# Altium footprint library 排针排座.PcbLib: 344 footprints (part 22 of 22)
Each footprint in its own frame and in the unit in brackets; x right, y up, seen from the top. Pads: shape width x height; smd on the part's side, far side on the other; paste and mask are expansions set on the pad; w line width, h text height; cw(c..) or ccw(c..) is an arc to the next point about the centre after c.
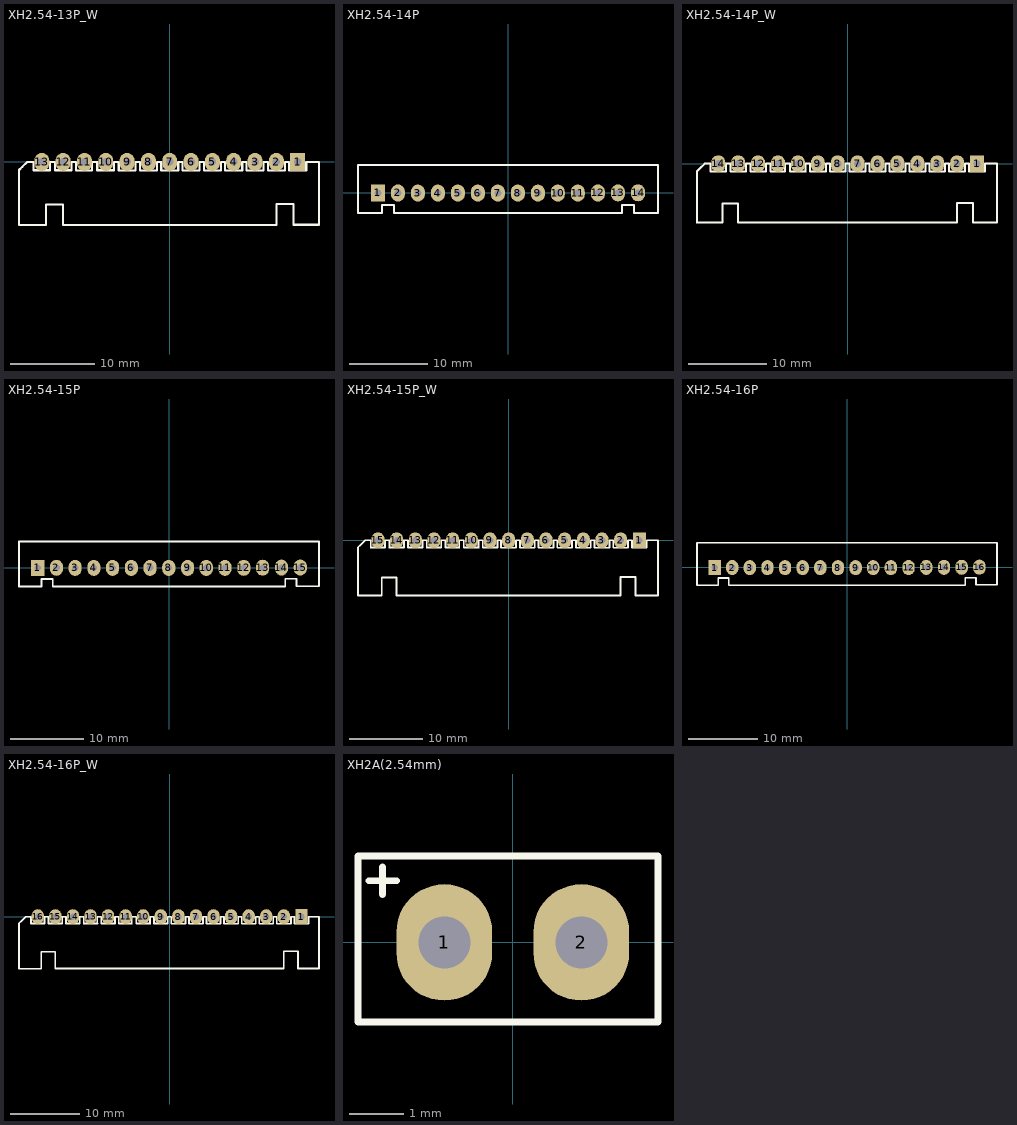
[diagram p21: the footprints below, top view; thin cyan lines are the x and y axes]

## XH2.54-13P_W [mil] "接插件，13P"
pads (13):
  rect 70x85 hole 35.43: 1(600,0)
  oval 70x85 hole 35.43: 2(500,0) 3(400,0) 4(300,0) 5(200,0) 6(100,0) 7(0,0) 8(-100,0) 9(-200,0) 10(-300,0) 11(-400,0) 12(-500,0) 13(-600,0)
Top Overlay:
  lines w10: -606.93,-295.35 -605.91,-296.38 ; -538.82,-39.45 -538.82,0 -561.34,0 -561.34,-38.66 -560.79,-39.21 -637.8,-39.21 -638.35,-38.66 -638.35,0 -668.9,0 -691.81,-22.91 -706.93,-38.03 -706.93,-295.35 -705.91,-296.38 -580,-296.38 -580,-199.13 -500,-199.13 -500,-295.35 500,-295.35 500,-197.09 580,-197.09 580,-294.88 700,-294.88 700,0 640,0 640,-40 560,-40 560,0 540,0 540,-40 460,-40 460,0 440,0 440,-40 360,-40 360,0 340,0 340,-40 260,-40 260,0 240,0 240,-40 160,-40 160,0 140,0 140,-40 60,-40 60,0 40,0 40,-40 -40,-40 -40,0 -60,0 -60,-40 -140,-40 -140,0 -160,0 -160,-39.45 -238.9,-39.45 -238.9,0 ; -538.35,0 -538.35,-38.66 -537.8,-39.21 -460.79,-39.21 -461.34,-38.66 -461.34,0 -438.82,0 -438.82,-39.45 -365.35,-39.45 -364.8,-38.9 -364.8,0 ; -364.33,0 -340.79,0 ; -340.24,-39.21 -340.24,0 ; -339.45,-39.21 -261.18,-39.21 -260.94,-38.98 -260.94,0 -239.45,0
3D body "XH2.54-13P_W.step": height 232.28, standoff -129.92, extent -690.13,-287.21 694.13,12

## XH2.54-14P [mil] "接插件，14P"
pads (14):
  rect 70x85 hole 35.43: 1(-650.5,-0.13)
  oval 70x85 hole 35.43: 2(-550.5,-0.13) 3(-451,-0.63) 4(-351,-0.63) 5(-251,-0.63) 6(-151,-0.63) 7(-51,-0.63) 8(49,-0.63) 9(149.5,-0.87) 10(249,-0.63) 11(349,-0.63) 12(449.5,-0.13) 13(550,0.37) 14(650.5,0.87)
Top Overlay:
  lines w10: 570.5,-100.13 -570.5,-100.13 -570.5,-60.13 -630.5,-60.13 -630.5,-100.13 -750.5,-100.13 -750.5,139.87 750.33,139.87 750.33,-99.13 630.5,-99.13 630.5,-59.13 570.5,-59.13 570.5,-99.13
3D body "XH2.54-14P.step": height 275.59, standoff -137.8, extent -744.25,-90.17 740,138.17

## XH2.54-14P_W [mil] "接插件，14P"
pads (14):
  rect 70x85 hole 35.43: 1(650,0)
  oval 70x85 hole 35.43: 2(550,0) 3(450,0) 4(350,0) 5(250,0) 6(150,0) 7(50,0) 8(-50,0) 9(-150,0) 10(-250,0) 11(-350,0) 12(-450,0) 13(-550,0) 14(-650,0)
Top Overlay:
  lines w10: -618.9,0 -588.35,0 ; -611.34,-38.66 -611.34,0 -588.82,0 -588.82,-39.45 ; -610.79,-39.21 -687.8,-39.21 -688.35,-38.66 -688.35,0 -718.9,0 -741.81,-22.91 -756.93,-38.03 -756.93,-295.35 -755.91,-296.38 -630,-296.38 -630,-199.13 -550,-199.13 -550,-295.35 550,-295.35 550,-197.09 630,-197.09 630,-294.88 750,-294.88 750,0 690,0 690,-40 610,-40 610,0 590,0 590,-40 510,-40 510,0 490,0 490,-40 410,-40 410,0 390,0 390,-40 310,-40 310,0 290,0 290,-40 210,-40 210,0 190,0 190,-40 110,-40 110,0 90,0 90,-40 10,-40 10,0 -10,0 -10,-40 -90,-40 -90,0 -110,0 -110,-39.45 -188.9,-39.45 -188.9,0 ; -511.34,-38.66 -511.34,0 -488.82,0 -488.82,-39.45 ; -510.79,-39.21 -587.8,-39.21 -588.35,-38.66 ; -488.35,0 -488.35,-38.66 -487.8,-39.21 -410.79,-39.21 ; -411.34,-38.66 -411.34,0 -388.82,0 -388.82,-39.45 -315.35,-39.45 -314.8,-38.9 -314.8,0 ; -314.33,0 -290.79,0 ; -290.24,-39.21 -290.24,0 ; -289.45,-39.21 -211.18,-39.21 -210.94,-38.98 -210.94,0 -189.45,0 ; -588.35,-38.66 -588.35,0 ; -588.35,-38.66 -588.35,0
3D body "XH2.54-14P_W.step": height 232.28, standoff -129.92, extent -740.13,-287.21 744.13,12

## XH2.54-15P [mil] "接插件，15P"
pads (15):
  rect 70x85 hole 35.43: 1(-700.75,-0.38)
  oval 70x85 hole 35.43: 2(-600.75,-0.38) 3(-501.25,-0.88) 4(-401.25,-0.88) 5(-301.25,-0.88) 6(-201.25,-0.88) 7(-101.25,-0.88) 8(-1.25,-0.88) 9(99.25,-1.12) 10(198.75,-0.88) 11(298.75,-0.88) 12(399.25,-0.38) 13(499.75,0.12) 14(600.25,0.62) 15(700.75,1.12)
Top Overlay:
  lines w10: 620.75,-100.38 -620.75,-100.38 -620.75,-60.38 -680.75,-60.38 -680.75,-100.38 -800.75,-100.38 -800.75,139.62 800.58,139.62 ; 620.75,-98.88 620.75,-58.88 680.75,-58.88 680.75,-98.88 800.58,-98.88 800.58,140.12
3D body "XH2.54-15P.step": height 275.59, standoff -137.8, extent -795,-92.35 789.25,136

## XH2.54-15P_W [mil] "接插件，15P"
pads (15):
  rect 70x85 hole 35.43: 1(700,0)
  oval 70x85 hole 35.43: 2(600,0) 3(500,0) 4(400,0) 5(300,0) 6(200,0) 7(100,0) 8(0,0) 9(-100,0) 10(-200,0) 11(-300,0) 12(-400,0) 13(-500,0) 14(-600,0) 15(-700,0)
Top Overlay:
  lines w10: -661.34,-38.66 -661.34,0 -638.82,0 -638.82,-39.45 ; -660.79,-39.21 -737.8,-39.21 -738.35,-38.66 -738.35,0 -768.9,0 -791.81,-22.91 -806.93,-38.03 -806.93,-295.35 -805.91,-296.38 -680,-296.38 -680,-199.13 -600,-199.13 -600,-295.35 600,-295.35 600,-197.09 680,-197.09 680,-294.88 800,-294.88 800,0 740,0 740,-40 660,-40 660,0 640,0 640,-40 560,-40 560,0 540,0 540,-40 460,-40 460,0 440,0 440,-40 360,-40 360,0 340,0 340,-40 260,-40 260,0 240,0 240,-40 160,-40 160,0 140,0 140,-40 60,-40 60,0 40,0 40,-40 -40,-40 -40,0 -60,0 -60,-39.45 -138.9,-39.45 -138.9,0 ; -568.9,0 -538.35,0 ; -561.34,-38.66 -561.34,0 -538.82,0 -538.82,-39.45 ; -560.79,-39.21 -637.8,-39.21 ; -461.34,-38.66 -461.34,0 -438.82,0 -438.82,-39.45 ; -460.79,-39.21 -537.8,-39.21 -538.35,-38.66 ; -438.35,0 -438.35,-38.66 -437.8,-39.21 -360.79,-39.21 ; -361.34,-38.66 -361.34,0 -338.82,0 -338.82,-39.45 -265.35,-39.45 -264.8,-38.9 -264.8,0 ; -264.33,0 -240.79,0 ; -240.24,-39.21 -240.24,0 ; -239.45,-39.21 -161.18,-39.21 -160.94,-38.98 -160.94,0 -139.45,0 ; -638.35,-38.66 -638.35,0 ; -638.35,-38.66 -637.8,-39.21 ; -638.35,-38.66 -638.35,0 ; -638.35,-38.66 -638.35,0 ; -638.35,-38.66 -637.8,-39.21 ; -638.35,0 -668.9,0 -638.35,0 ; -538.35,-38.66 -538.35,0 ; -538.35,-38.66 -538.35,0
3D body "XH2.54-15P_W.step": height 232.28, standoff -129.92, extent -790.13,-287.21 794.13,12

## XH2.54-16P [mil] "接插件，16P"
pads (16):
  rect 70x85 hole 35.43: 1(-751,-0.63)
  oval 70x85 hole 35.43: 2(-651,-0.63) 3(-551.5,-1.13) 4(-451.5,-1.13) 5(-351.5,-1.13) 6(-251.5,-1.13) 7(-151.5,-1.13) 8(-51.5,-1.13) 9(49,-1.37) 10(148.5,-1.13) 11(248.5,-1.13) 12(349,-0.63) 13(449.5,-0.13) 14(550,0.37) 15(650.5,0.87) 16(751,1.37)
Top Overlay:
  lines w10: 671,-100.63 -671,-100.63 -671,-60.63 -731,-60.63 -731,-100.63 -851,-100.63 -851,139.37 850.83,139.37 850.83,-98.63 731,-98.63 731,-58.63 671,-58.63 671,-98.63
3D body "XH2.54-16P.step": height 275.59, standoff -137.8, extent -846.13,-91.35 838.13,137

## XH2.54-16P_W [mil] "接插件，16P"
pads (16):
  rect 70x85 hole 35.43: 1(750,0)
  oval 70x85 hole 35.43: 2(650,0) 3(550,0) 4(450,0) 5(350,0) 6(250,0) 7(150,0) 8(50,0) 9(-50,0) 10(-150,0) 11(-250,0) 12(-350,0) 13(-450,0) 14(-550,0) 15(-650,0) 16(-750,0)
Top Overlay:
  lines w10: -711.34,-38.66 -711.34,0 -688.82,0 -688.82,-39.45 ; -710.79,-39.21 -787.8,-39.21 -788.35,-38.66 -788.35,0 -818.9,0 -841.81,-22.91 -856.93,-38.03 -856.93,-295.35 -855.91,-296.38 -730,-296.38 -730,-199.13 -650,-199.13 -650,-295.35 650,-295.35 650,-197.09 730,-197.09 730,-294.88 850,-294.88 850,0 790,0 790,-40 710,-40 710,0 690,0 690,-40 610,-40 610,0 590,0 590,-40 510,-40 510,0 490,0 490,-40 410,-40 410,0 390,0 390,-40 310,-40 310,0 290,0 290,-40 210,-40 210,0 190,0 190,-40 110,-40 110,0 90,0 90,-40 10,-40 10,0 -10,0 -10,-39.45 -88.9,-39.45 -88.9,0 ; -611.34,-38.66 -611.34,0 -588.82,0 -588.82,-39.45 ; -610.79,-39.21 -687.8,-39.21 ; -518.9,0 -488.35,0 ; -511.34,-38.66 -511.34,0 -488.82,0 -488.82,-39.45 ; -510.79,-39.21 -587.8,-39.21 ; -411.34,-38.66 -411.34,0 -388.82,0 -388.82,-39.45 ; -410.79,-39.21 -487.8,-39.21 -488.35,-38.66 ; -388.35,0 -388.35,-38.66 -387.8,-39.21 -310.79,-39.21 ; -311.34,-38.66 -311.34,0 -288.82,0 -288.82,-39.45 -215.35,-39.45 -214.8,-38.9 -214.8,0 ; -214.33,0 -190.79,0 ; -190.24,-39.21 -190.24,0 ; -189.45,-39.21 -111.18,-39.21 -110.94,-38.98 -110.94,0 -89.45,0 ; -718.9,0 -688.35,0 ; -718.9,0 -688.35,0 ; -718.9,0 -688.35,0 ; -688.35,-38.66 -687.8,-39.21 ; -688.35,-38.66 -688.35,0 ; -688.35,-38.66 -687.8,-39.21 ; -688.35,-38.66 -688.35,0 ; -688.35,-38.66 -688.35,0 ; -688.35,-38.66 -687.8,-39.21 ; -688.35,-38.66 -688.35,0 ; -588.35,-38.66 -588.35,0 ; -588.35,-38.66 -587.8,-39.21 ; -588.35,-38.66 -588.35,0 ; -588.35,-38.66 -588.35,0 ; -588.35,-38.66 -587.8,-39.21 ; -588.35,0 -618.9,0 -588.35,0 ; -488.35,-38.66 -488.35,0 ; -488.35,-38.66 -488.35,0
3D body "XH2.54-16P_W.step": height 232.28, standoff -129.92, extent -840.13,-287.21 844.13,12

## XH2A(2.54mm) [mil] "手机唛扬声器接口"
height 21.65
pads (2):
  oval 70x85 hole 38: 1(-50,0) 2(50,0)
Top Overlay:
  lines w5: -105,45 -85,45 ; -95,35 -95,55 ; -113,-58 106,-58 106,63 -113,63 -113,-58